# Altium footprint library connectors_socets.pcblib: 567 footprints (part 34 of 36)
Each footprint in its own frame and in the unit in brackets; x right, y up, seen from the top. Pads: shape width x height; smd on the part's side, far side on the other; paste and mask are expansions set on the pad; w line width, h text height; cw(c..) or ccw(c..) is an arc to the next point about the centre after c.
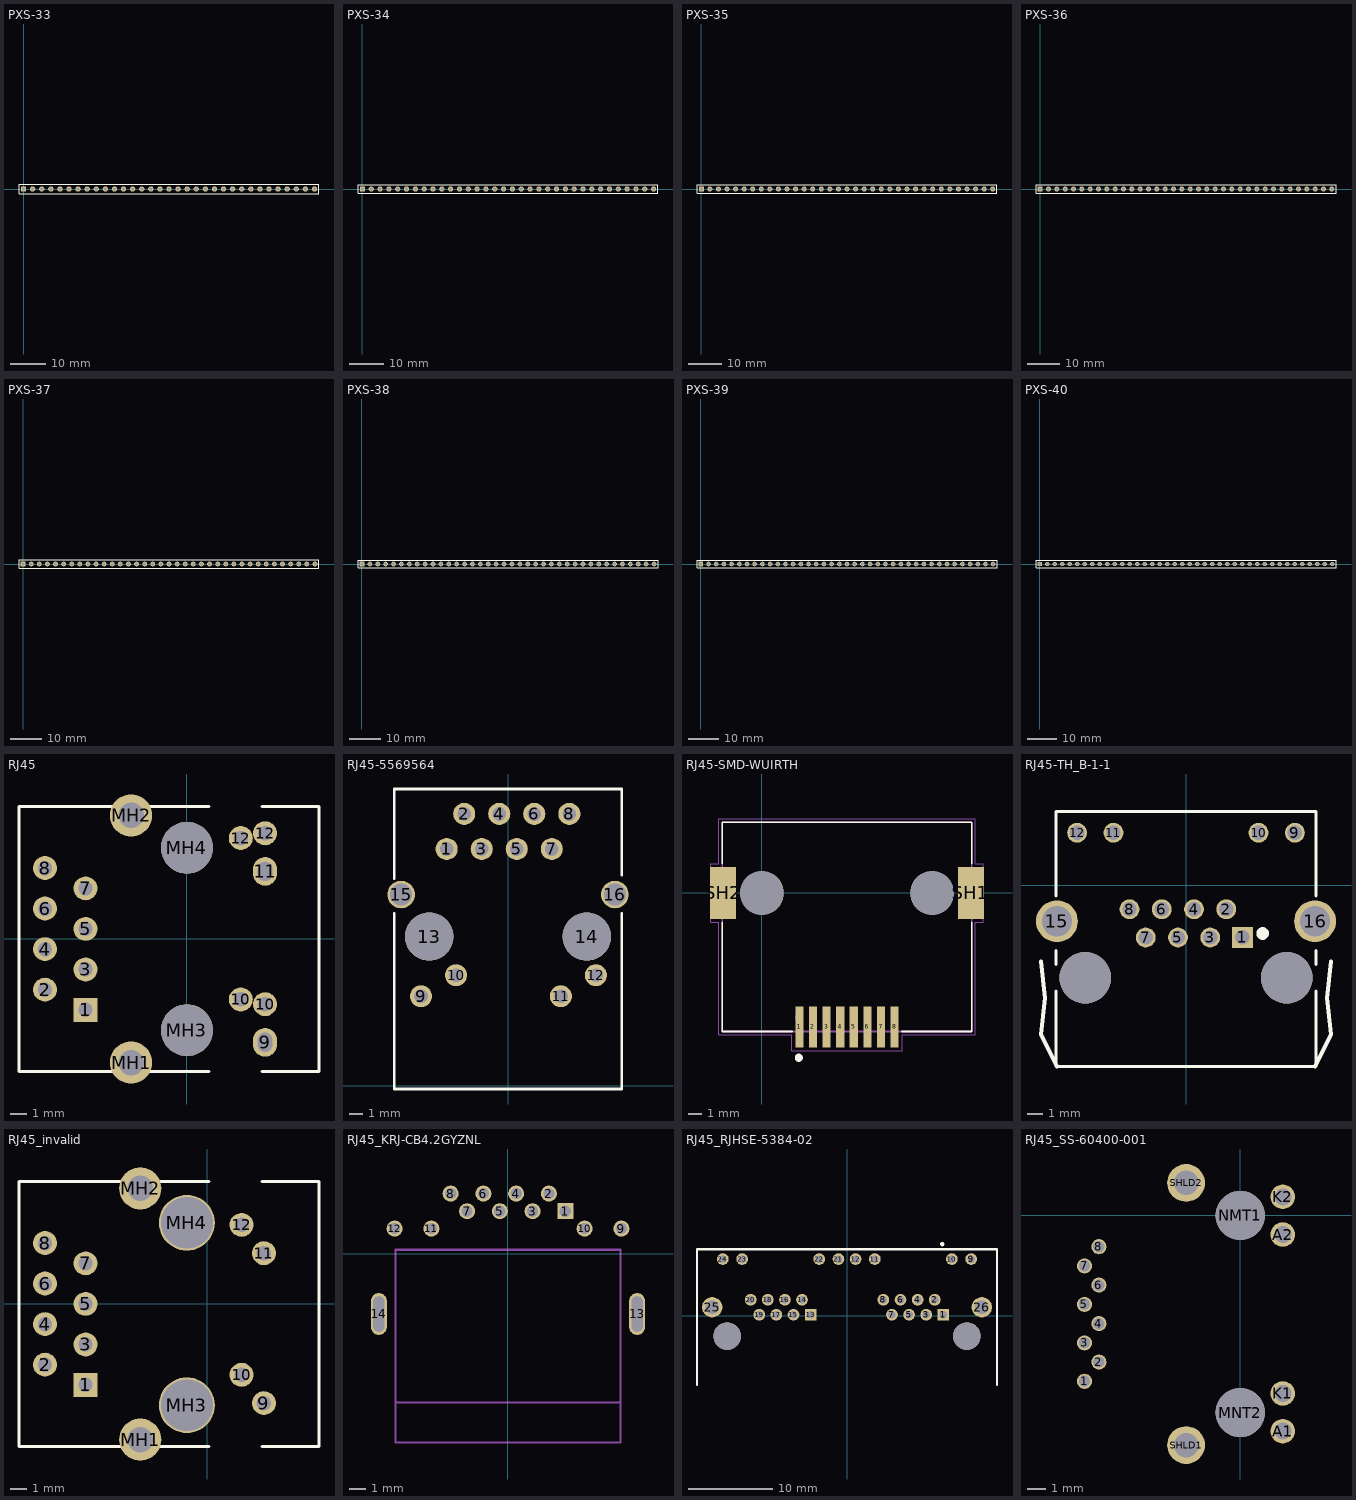
[diagram p33: the footprints below, top view; thin cyan lines are the x and y axes]

## PXS-33 [mm] "Connector; Header; 33 Position"
height 0.001
pads (33):
  rect 1.5x1.5 hole 0.9: 1(0,0)
  round 1.5 hole 0.9: 2(2.54,0) 3(5.08,0) 4(7.62,0) 5(10.16,0) 6(12.7,0) 7(15.24,0) 8(17.78,0) 9(20.32,0) 10(22.86,0) 11(25.4,0) 12(27.94,0) 13(30.48,0) 14(33.02,0) 15(35.56,0) 16(38.1,0) 17(40.64,0) 18(43.18,0) 19(45.72,0) 20(48.26,0) 21(50.8,0) 22(53.34,0) 23(55.88,0) 24(58.42,0) 25(60.96,0) 26(63.5,0) 27(66.04,0) 28(68.58,0) 29(71.12,0) 30(73.66,0) 31(76.2,0) 32(78.74,0) 33(81.28,0)
Top Overlay:
  lines w0.2: -1.27,-1.27 -1.27,1.27 82.55,1.27 82.55,-1.27 -1.27,-1.27

## PXS-34 [mm] "Connector; Header; 34 Position"
height 0.001
pads (34):
  rect 1.5x1.5 hole 0.9: 1(0,0)
  round 1.5 hole 0.9: 2(2.54,0) 3(5.08,0) 4(7.62,0) 5(10.16,0) 6(12.7,0) 7(15.24,0) 8(17.78,0) 9(20.32,0) 10(22.86,0) 11(25.4,0) 12(27.94,0) 13(30.48,0) 14(33.02,0) 15(35.56,0) 16(38.1,0) 17(40.64,0) 18(43.18,0) 19(45.72,0) 20(48.26,0) 21(50.8,0) 22(53.34,0) 23(55.88,0) 24(58.42,0) 25(60.96,0) 26(63.5,0) 27(66.04,0) 28(68.58,0) 29(71.12,0) 30(73.66,0) 31(76.2,0) 32(78.74,0) 33(81.28,0) 34(83.82,0)
Top Overlay:
  lines w0.2: -1.27,-1.27 85.09,-1.27 85.09,1.27 -1.27,1.27 -1.27,-1.27

## PXS-35 [mm] "Connector; Header; 35 Position"
height 0.001
pads (35):
  rect 1.5x1.5 hole 0.9: 1(0,0)
  round 1.5 hole 0.9: 2(2.54,0) 3(5.08,0) 4(7.62,0) 5(10.16,0) 6(12.7,0) 7(15.24,0) 8(17.78,0) 9(20.32,0) 10(22.86,0) 11(25.4,0) 12(27.94,0) 13(30.48,0) 14(33.02,0) 15(35.56,0) 16(38.1,0) 17(40.64,0) 18(43.18,0) 19(45.72,0) 20(48.26,0) 21(50.8,0) 22(53.34,0) 23(55.88,0) 24(58.42,0) 25(60.96,0) 26(63.5,0) 27(66.04,0) 28(68.58,0) 29(71.12,0) 30(73.66,0) 31(76.2,0) 32(78.74,0) 33(81.28,0) 34(83.82,0) 35(86.36,0)
Top Overlay:
  lines w0.2: -1.27,-1.27 -1.27,1.27 87.63,1.27 87.63,-1.27 -1.27,-1.27

## PXS-36 [mm] "Connector; Header; 36 Position"
height 0.001
pads (36):
  rect 1.5x1.5 hole 0.9: 1(0,0)
  round 1.5 hole 0.9: 2(2.54,0) 3(5.08,0) 4(7.62,0) 5(10.16,0) 6(12.7,0) 7(15.24,0) 8(17.78,0) 9(20.32,0) 10(22.86,0) 11(25.4,0) 12(27.94,0) 13(30.48,0) 14(33.02,0) 15(35.56,0) 16(38.1,0) 17(40.64,0) 18(43.18,0) 19(45.72,0) 20(48.26,0) 21(50.8,0) 22(53.34,0) 23(55.88,0) 24(58.42,0) 25(60.96,0) 26(63.5,0) 27(66.04,0) 28(68.58,0) 29(71.12,0) 30(73.66,0) 31(76.2,0) 32(78.74,0) 33(81.28,0) 34(83.82,0) 35(86.36,0) 36(88.9,0)
Top Overlay:
  lines w0.2: -1.27,-1.27 90.17,-1.27 90.17,1.27 -1.27,1.27 -1.27,-1.27

## PXS-37 [mm] "Connector; Header; 37 Position"
height 0.001
pads (37):
  rect 1.5x1.5 hole 0.9: 1(0,0)
  round 1.5 hole 0.9: 2(2.54,0) 3(5.08,0) 4(7.62,0) 5(10.16,0) 6(12.7,0) 7(15.24,0) 8(17.78,0) 9(20.32,0) 10(22.86,0) 11(25.4,0) 12(27.94,0) 13(30.48,0) 14(33.02,0) 15(35.56,0) 16(38.1,0) 17(40.64,0) 18(43.18,0) 19(45.72,0) 20(48.26,0) 21(50.8,0) 22(53.34,0) 23(55.88,0) 24(58.42,0) 25(60.96,0) 26(63.5,0) 27(66.04,0) 28(68.58,0) 29(71.12,0) 30(73.66,0) 31(76.2,0) 32(78.74,0) 33(81.28,0) 34(83.82,0) 35(86.36,0) 36(88.9,0) 37(91.44,0)
Top Overlay:
  lines w0.2: -1.27,-1.27 -1.27,1.27 92.71,1.27 92.71,-1.27 -1.27,-1.27

## PXS-38 [mm] "Connector; Header; 38 Position"
height 0.001
pads (38):
  rect 1.5x1.5 hole 0.9: 1(0,0)
  round 1.5 hole 0.9: 2(2.54,0) 3(5.08,0) 4(7.62,0) 5(10.16,0) 6(12.7,0) 7(15.24,0) 8(17.78,0) 9(20.32,0) 10(22.86,0) 11(25.4,0) 12(27.94,0) 13(30.48,0) 14(33.02,0) 15(35.56,0) 16(38.1,0) 17(40.64,0) 18(43.18,0) 19(45.72,0) 20(48.26,0) 21(50.8,0) 22(53.34,0) 23(55.88,0) 24(58.42,0) 25(60.96,0) 26(63.5,0) 27(66.04,0) 28(68.58,0) 29(71.12,0) 30(73.66,0) 31(76.2,0) 32(78.74,0) 33(81.28,0) 34(83.82,0) 35(86.36,0) 36(88.9,0) 37(91.44,0) 38(93.98,0)
Top Overlay:
  lines w0.2: -1.27,-1.27 95.25,-1.27 95.25,1.27 -1.27,1.27 -1.27,-1.27

## PXS-39 [mm] "Connector; Header; 39 Position"
height 0.001
pads (39):
  rect 1.5x1.5 hole 0.9: 1(0,0)
  round 1.5 hole 0.9: 2(2.54,0) 3(5.08,0) 4(7.62,0) 5(10.16,0) 6(12.7,0) 7(15.24,0) 8(17.78,0) 9(20.32,0) 10(22.86,0) 11(25.4,0) 12(27.94,0) 13(30.48,0) 14(33.02,0) 15(35.56,0) 16(38.1,0) 17(40.64,0) 18(43.18,0) 19(45.72,0) 20(48.26,0) 21(50.8,0) 22(53.34,0) 23(55.88,0) 24(58.42,0) 25(60.96,0) 26(63.5,0) 27(66.04,0) 28(68.58,0) 29(71.12,0) 30(73.66,0) 31(76.2,0) 32(78.74,0) 33(81.28,0) 34(83.82,0) 35(86.36,0) 36(88.9,0) 37(91.44,0) 38(93.98,0) 39(96.52,0)
Top Overlay:
  lines w0.2: -1.27,-1.27 -1.27,1.27 97.79,1.27 97.79,-1.27 -1.27,-1.27

## PXS-40 [mm] "Connector; Header; 40 Position"
height 0.001
pads (40):
  rect 1.5x1.5 hole 0.9: 1(0,0)
  round 1.5 hole 0.9: 2(2.54,0) 3(5.08,0) 4(7.62,0) 5(10.16,0) 6(12.7,0) 7(15.24,0) 8(17.78,0) 9(20.32,0) 10(22.86,0) 11(25.4,0) 12(27.94,0) 13(30.48,0) 14(33.02,0) 15(35.56,0) 16(38.1,0) 17(40.64,0) 18(43.18,0) 19(45.72,0) 20(48.26,0) 21(50.8,0) 22(53.34,0) 23(55.88,0) 24(58.42,0) 25(60.96,0) 26(63.5,0) 27(66.04,0) 28(68.58,0) 29(71.12,0) 30(73.66,0) 31(76.2,0) 32(78.74,0) 33(81.28,0) 34(83.82,0) 35(86.36,0) 36(88.9,0) 37(91.44,0) 38(93.98,0) 39(96.52,0) 40(99.06,0)
Top Overlay:
  lines w0.2: -1.27,-1.27 -1.27,1.27 100.33,1.27 100.33,-1.27 -1.27,-1.27

## RJ45 [mm]
height 12
pads (18):
  rect 1.5x1.5 hole 0.9: 1(-6.35,-4.45)
  round 1.5 hole 0.9: 2(-8.89,-3.18) 3(-6.35,-1.91) 4(-8.89,-0.64) 5(-6.35,0.63) 6(-8.89,1.9) 7(-6.35,3.17) 8(-8.89,4.44) 10(3.38,-3.79) 10(4.9,-4.09) 12(3.38,6.32) 12(4.9,6.62)
  oval 1.5x1.8 hole 0.9 slot 1.2 at 90 deg: 9(4.9,-6.48) 11(4.9,4.23)
  round 2.65 hole 1.6: MH1(-3.5,-7.75) MH2(-3.5,7.74)
  round 3.25 hole 3.25 unplated: MH3(0,-5.72) MH4(0,5.71)
Top Overlay:
  lines w0.2: 1.378,-8.305 -10.52,-8.305 -10.52,8.295 1.378,8.295 ; 4.722,-8.305 8.28,-8.305 8.28,8.295 4.722,8.295
3D body "RJ-45-new.stp": height 12.71, standoff 0, extent -9.75,-7.51 7.75,7.51

## RJ45-5569564 [mm]
pads (16):
  round 1.6 hole 1: 1(-4.445,17.15) 2(-3.175,19.696) 3(-1.905,17.15) 4(-0.635,19.696) 5(0.635,17.15) 6(1.905,19.696) 7(3.175,17.15) 8(4.445,19.696) 9(-6.307,6.477) 10(-3.767,8.001) 11(3.832,6.477) 12(6.372,8.001)
  round 3.5 hole 3.5 unplated: 13(-5.715,10.8) 14(5.715,10.8)
  round 2 hole 1.6: 15(-7.747,13.848) 16(7.747,13.848)
Top Overlay:
  lines w0.2: -8.25,12.5 -8.25,-0.25 8.25,-0.25 8.25,12.5 ; -8.25,15 -8.25,21.5 8.25,21.5 8.25,15.25
3D body "569564-4.stp": height 14.77, standoff -4.06, extent -7.936,-0.064 7.929,21.272

## RJ45-SMD-WUIRTH [mm]
pads (12):
  rect 0.61x3.05 smd: 1(2.794,-10) 2(3.81,-10) 3(4.826,-10) 4(5.842,-10) 5(6.858,-10) 6(7.874,-10) 7(8.89,-10) 8(9.906,-10)
  rect 1.945x3.9 smd: SH1(15.597,0) SH2(-2.897,0)
  round 3.25 hole 3.25 unplated: ""(0,0) ""(12.7,0)
Top Overlay:
  circle w0.4: c2.75,-12.3 r0.1
  lines w0.127: -2.97,-2.2 -2.97,-10.34 2.25,-10.34 ; -2.97,2.2 -2.97,5.28 15.67,5.28 15.67,2.2 ; 10.45,-10.34 15.67,-10.34 15.67,-2.2
Plata3D:
  circle w0.4: c2.75,-9.3 r0.1
  lines w0.127: -2.97,-10.34 -2.97,5.28 15.67,5.28 15.67,-10.34 -2.97,-10.34
Board3D:
  lines w0.05: -3.82,-2.2 -3.82,2.2 -3.22,2.2 -3.22,5.53 15.92,5.53 15.92,2.2 16.52,2.2 16.52,-2.2 15.92,-2.2 15.92,-10.59 10.465,-10.59 10.465,-11.775 2.235,-11.775 2.235,-10.59 -3.22,-10.59 -3.22,-2.2 -3.82,-2.2
3D body "6339160-1.stp": height 14.73, standoff -1.2, extent -3.05,-11.24 15.75,5.24

## RJ45-TH_B-1-1 [mm]
pads (16):
  rect 1.3x1.3 hole 0.914: 1(3.556,-3.299)
  round 1.25 hole 0.9: 2(2.54,-1.519) 3(1.524,-3.299) 4(0.508,-1.519) 5(-0.508,-3.299) 6(-1.524,-1.519) 7(-2.54,-3.299) 8(-3.556,-1.519) 9(6.861,3.299) 10(4.569,3.299) 11(-4.569,3.299) 12(-6.861,3.299)
  round 2.642 hole 1.9: 15(-8.13,-2.279) 16(8.13,-2.279)
  round 3.25 hole 3.25 unplated: ""(-6.35,-5.839) ""(6.35,-5.839)
Top Overlay:
  circle w0.4: c4.826,-3.048 r0.2
  lines w0.201: -8.184,-6.68 -8.184,-11.427 8.197,-11.427 8.197,-6.68 ; -8.184,-4.986 -8.184,-4.127 ; -8.184,-0.681 -8.184,4.635 -4.366,4.635 ; -4.608,4.635 6.942,4.635 ; 6.67,4.635 8.197,4.635 8.197,-0.681 ; 8.197,-4.986 8.197,-4.127
  lines w0.254: -9.144,-4.823 -8.89,-7.109 -9.144,-9.395 -8.128,-11.427 ; 8.128,-11.427 9.144,-9.395 8.89,-7.109 9.144,-4.823
Board3D:
  circle w1.5: c-6.35,-5.839 r0.75
  circle w1.5: c6.35,-5.839 r0.75
3D body "ACC-M-RJHSE-548X-REVT1.step": height 14.92, standoff -3.92, extent -9.853,-11.741 9.853,4.677

## RJ45_invalid [mm]
height 12
pads (16):
  rect 1.5x1.5 hole 0.9: 1(-7.62,-5.08)
  round 1.5 hole 0.9: 2(-10.16,-3.81) 3(-7.62,-2.54) 4(-10.16,-1.27) 5(-7.62,0) 6(-10.16,1.27) 7(-7.62,2.54) 8(-10.16,3.81) 9(3.556,-6.223) 10(2.159,-4.445) 11(3.556,3.175) 12(2.159,4.953)
  round 2.65 hole 1.6: MH1(-4.191,-8.51) MH2(-4.191,7.24)
  round 3.5 hole 3.25: MH3(-1.27,-6.35) MH4(-1.27,5.08)
Top Overlay:
  lines w0.2: 0.108,-8.935 -11.79,-8.935 -11.79,7.665 0.108,7.665 ; 3.452,-8.935 7.01,-8.935 7.01,7.665 3.452,7.665

## RJ45_KRJ-CB4.2GYZNL [mm] "RJ45  connector, right angle"
height 1
pads (14):
  rect 1x1 hole 0.7: 1(3.57,2.65)
  round 1 hole 0.7: 2(2.55,3.75) 3(1.53,2.65) 4(0.51,3.75) 5(-0.51,2.65) 6(-1.53,3.75) 7(-2.55,2.65) 8(-3.57,3.75) 9(7.06,1.57) 10(4.77,1.57) 11(-4.77,1.57) 12(-7.06,1.57)
  oval 1x2.6 hole 0.7 slot 2.2 at 90 deg: 13(8.04,-3.75) 14(-8.04,-3.75)
Board:
  lines w0.127: -7,-9.25 7,-9.25 ; -7,-11.75 -7,0.25 7,0.25 7,-11.75 -7,-11.75
3D body: height 4.2, standoff -4.2, extent -7,-9.25 7,0.25
3D body: height 6.8, standoff 0, extent -8.103,-9.25 8.077,3.465
3D body: height 6.8, standoff -4.2, extent -8.103,-11.75 8.077,-9.25

## RJ45_RJHSE-5384-02 [mil]
pads (28):
  rect 54.69x54.69 hole 35 paste-39370.1 mask+0: 1(450,5) 13(-170,5)
  round 54.69 hole 35 paste-39370.1 mask+0: 2(410,75) 3(370,5) 4(330,75) 5(290,5) 6(250,75) 7(210,5) 8(170,75) 9(580,265) 10(490,265) 11(130,265) 12(40,265) 14(-210,75) 15(-250,5) 16(-290,75) 17(-330,5) 18(-370,75) 19(-410,5) 20(-450,75) 21(-40,265) 22(-130,265) 23(-490,265) 24(-580,265)
  round 95.28 hole 61.81 paste-39370.1 mask+0: 25(-630,40) 26(630,40)
  round 127.95 hole 127.95 unplated paste-39370.1 mask+0: ""(-560,-95) ""(560,-95)
Top Overlay:
  circle w9.84: c444.88,334.65 r4.92
  lines w10: -700.79,-322.83 -700.79,311.02 700.79,311.02 700.79,-322.83
3D body "Conn_Amphenol_RJHSE-5384-02_eec.STEP": height 592.92, standoff -149, extent -697.92,-326.24 697.93,309

## RJ45_SS-60400-001 [mm]
pads (16):
  round 0.8 hole 0.6: 1(-8.228,-8.763) 2(-7.466,-7.747) 3(-8.228,-6.731) 4(-7.466,-5.715) 5(-8.228,-4.699) 6(-7.466,-3.683) 7(-8.228,-2.667) 8(-7.466,-1.651)
  round 1.3 hole 0.9: A1(2.248,-11.397) A2(2.248,-1.009) K1(2.248,-9.405) K2(2.248,0.983)
  round 2.6 hole 2.6 unplated: MNT2(0,-10.414) NMT1(0,0)
  round 2 hole 1.3: SHLD1(-2.857,-12.133) SHLD2(-2.857,1.719)
3D body "SS-60400-001.stp": height 16, standoff -3.46, extent -16.908,-15.916 10.859,5.467